# Altium footprint library Pcblib.PcbLib: 281 footprints (part 16 of 18)
Each footprint in its own frame and in the unit in brackets; x right, y up, seen from the top. Pads: shape width x height; smd on the part's side, far side on the other; paste and mask are expansions set on the pad; w line width, h text height; cw(c..) or ccw(c..) is an arc to the next point about the centre after c.
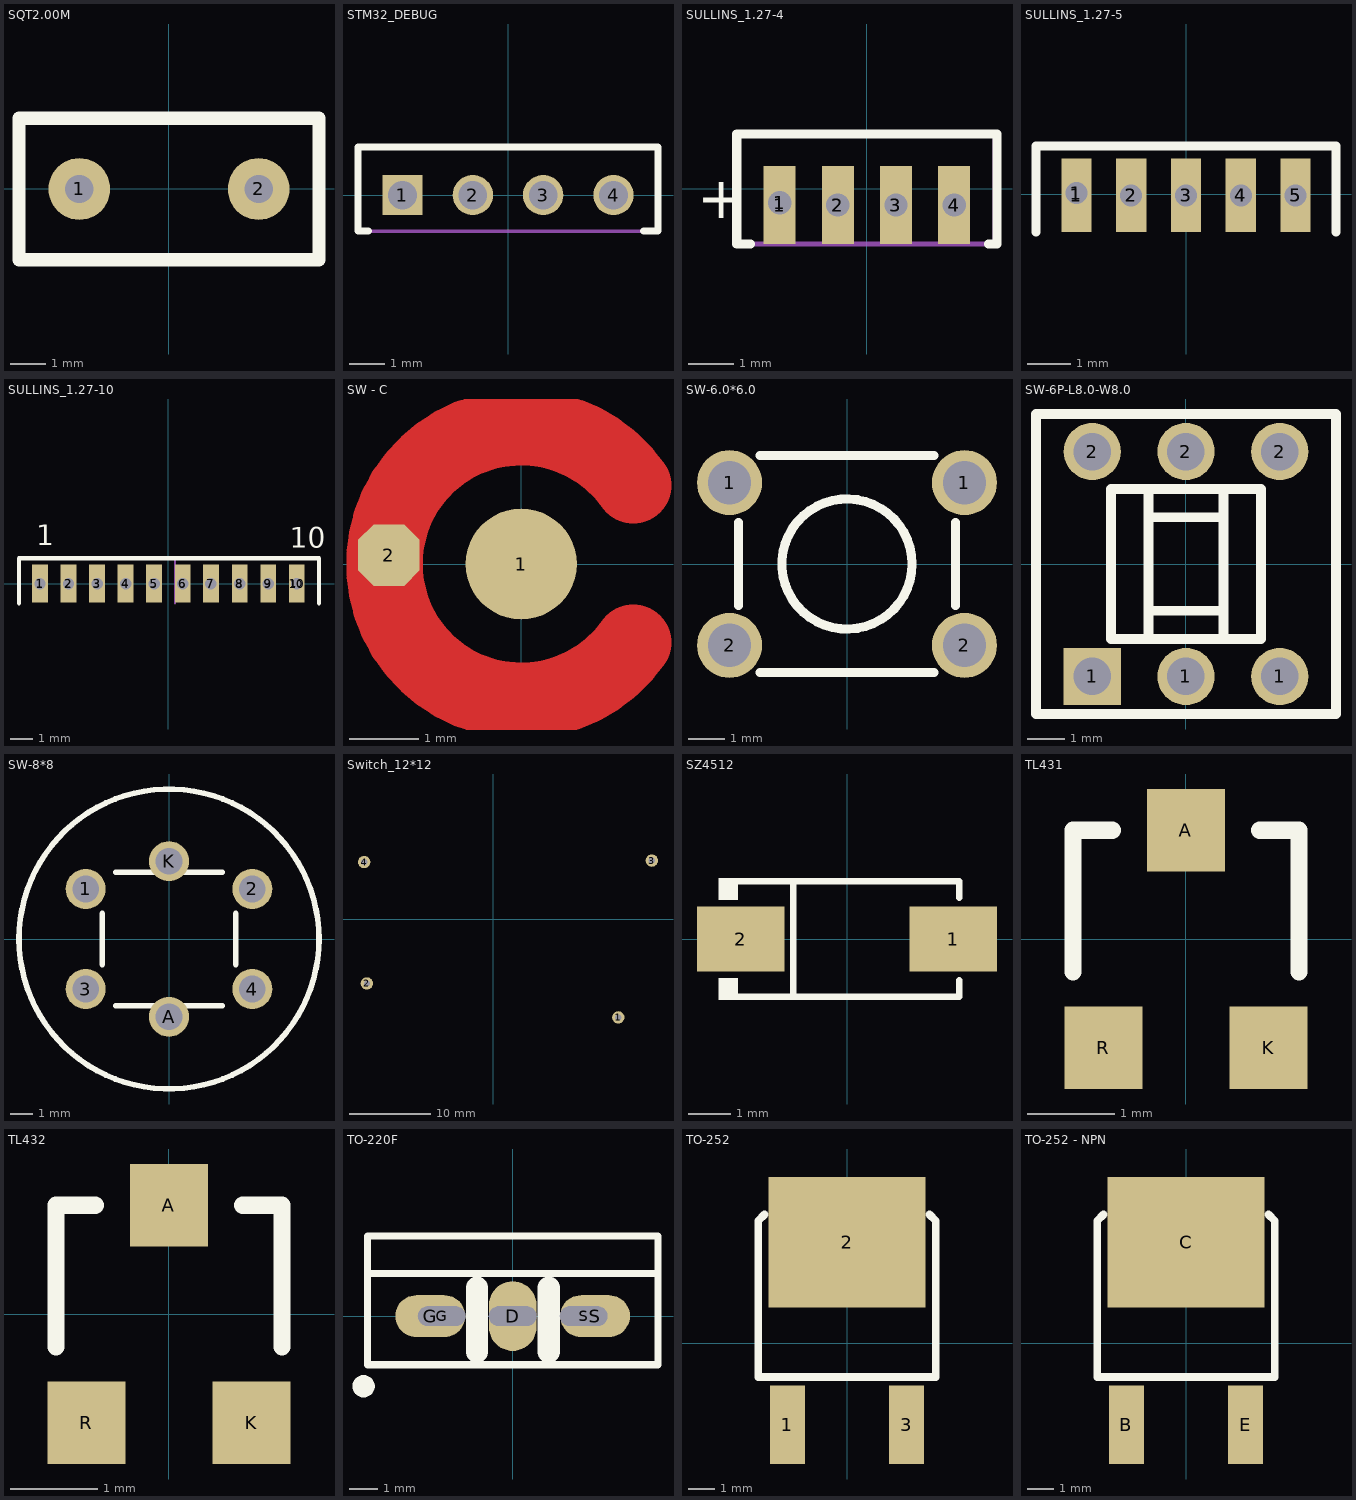
[diagram p15: the footprints below, top view; thin cyan lines are the x and y axes]

## SQT2.00M [mm]
height 17.5
pads (2):
  round 1.75 hole 0.8: 1(-2.54,0) 2(2.54,0)
Top Overlay:
  lines w0.381: -4.25,2 -4.25,-2 4.25,-2 4.25,2 -4.241,2

## STM32_DEBUG [mil]
pads (4):
  rect 45x45 hole 32: 1(-118.11,0)
  round 45 hole 32: 2(-39.37,0) 3(39.37,0) 4(118.11,0)
Top Overlay:
  lines w7.87: -156.11,-40.46 -167.92,-40.46 -167.92,54.02 -160.64,54.02 167.92,54.02 167.92,-40.46 151.89,-40.46
Mechanical 5:
  lines w3.94: -167.92,-40.46 166.89,-40.46 166.89,54.02 -167.92,54.02 -167.92,-40.46

## SULLINS_1.27-4 [mm] "Receptacle, 1.27mm, 6x1, SMT"
height 4.85
pads (8):
  rect 0.7x1.7 smd paste-1: 1(-1.905,-0.35) 2(-0.635,-0.35) 3(0.635,-0.35) 4(1.905,-0.35)
  round 0.686 hole 0.508: 1(-1.905,-0.3) 2(-0.635,-0.35) 3(0.635,-0.35) 4(1.905,-0.35)
Top Overlay:
  lines w0.2: -2.54,-1.2 -2.84,-1.2 -2.84,1.2 -2.655,1.2 2.794,1.2 ; 2.655,-1.2 2.84,-1.2 2.84,1.2
  text "+" at -3.708,-0.635 h0.91
Mechanical 5:
  lines w0.1: -2.84,-1.2 -2.84,1.2 2.794,1.2 2.794,-1.2 -2.84,-1.2
3D body: height 4.85, standoff 0.5, extent -2.84,-1.2 2.84,0
3D body: height 0.5, standoff 0.15, extent -2.84,-1.2 2.84,-0.635
3D body: height 4.85, standoff 4.65, extent -2.405,0.3 -1.405,0.5
3D body: height 4.85, standoff 4.65, extent -2.405,-0.5 -2.205,0.5
3D body: height 4.85, standoff 4.65, extent -2.405,-0.5 -1.405,-0.3
3D body: height 4.85, standoff 4.65, extent -1.605,-0.5 -1.405,0.5
3D body: height 4.85, standoff 4.65, extent -0.335,-0.5 -0.135,0.5
3D body: height 4.85, standoff 4.65, extent -1.135,-0.5 -0.135,-0.3
3D body: height 4.85, standoff 4.65, extent -1.135,-0.5 -0.935,0.5
3D body: height 4.85, standoff 4.65, extent -1.135,0.3 -0.135,0.5
3D body: height 4.85, standoff 4.65, extent 0.935,-0.5 1.135,0.5
3D body: height 4.85, standoff 4.65, extent 0.135,-0.5 1.135,-0.3
3D body: height 4.85, standoff 4.65, extent 0.135,-0.5 0.335,0.5
3D body: height 4.85, standoff 4.65, extent 0.135,0.3 1.135,0.5
3D body: height 4.85, standoff 4.65, extent 2.205,-0.5 2.405,0.5
3D body: height 4.85, standoff 4.65, extent 1.405,-0.5 2.405,-0.3
3D body: height 4.85, standoff 4.65, extent 1.405,-0.5 1.605,0.5
3D body: height 4.85, standoff 4.65, extent 1.405,0.3 2.405,0.5
3D body: height 4.85, standoff 4.65, extent 2.675,-0.5 2.875,0.5
3D body: height 0.5, standoff 0, extent -2.105,0.485 -1.705,0.635
3D body: height 0.5, standoff 0, extent 0.435,0.485 0.835,0.635
3D body: height 0.5, standoff 0, extent -0.835,-0.635 -0.435,-0.485
3D body: height 0.5, standoff 0, extent 1.705,-0.635 2.105,-0.485
3D body: height 0.6, standoff 0.5, extent -2.84,-0.635 2.84,0.635

## SULLINS_1.27-5 [mil] "Receptacle, 1.27mm, 6x1, SMT"
height 190.94
pads (10):
  rect 27.56x66.93 smd paste-39.37: 1(-100,-0.98) 2(-50,-0.98) 3(0,-0.98) 4(50,-0.98) 5(100,-0.98)
  round 27 hole 20: 1(-100,0.98) 2(-50,-0.98) 3(0,-0.98) 4(50,-0.98) 5(100,-0.98)
Top Overlay:
  lines w7.87: -136.81,-34.45 -136.81,44 136.81,44 136.81,-34.45
Mechanical 5:
  lines w3.94: -136.81,-34.45 -136.81,44 136.81,44 136.81,-34.45

## SULLINS_1.27-10 [mil] "Receptacle, 1.27mm, 6x1, SMT"
height 190.94
pads (20):
  rect 27.56x66.93 smd paste-39.37: 1(-225,0) 2(-175,0) 3(-125,0) 4(-75,0) 5(-25,0) 6(25,0) 7(74.61,0) 8(125,0) 9(175,0) 10(225,0)
  round 27 hole 20: 1(-225,0) 2(-175,0) 3(-125,0) 4(-75,0) 5(-25,0) 6(25,0) 7(74.61,0) 8(125,0) 9(175,0) 10(225,0)
Top Overlay:
  lines w7.87: -261.81,-34.45 -261.81,44 264,44 264,-34.45
  text "10" at 213,63 h36
  text "1" at -232,67 h36
Mechanical 5:
  lines w3.94: -261.81,-34.45 -261.81,44 11.81,44 11.81,-34.45

## SW - C [mil]
pads (2):
  round 62.99 smd paste-39.37: 1(0,0)
  oct 35x35 smd paste-39.37: 2(-75,5)
Top Layer:
  lines w43.31: 63.52,-44.48 cw(c0,0) 63.52,44.48
Top Solder:
  lines w50.31: 63.52,-44.48 cw(c0,0) 63.52,44.48

## SW-6.0*6.0 [mm]
pads (4):
  round 1.8 hole 1.2: 1(-3.25,2.25) 1(3.25,2.25) 2(-3.25,-2.25) 2(3.25,-2.25)
Top Overlay:
  circle w0.254: c0,0 r1.8
  lines w0.254: -3,-1.147 -3,1.147 ; -2.404,-3 2.404,-3 ; -2.404,3 2.404,3 ; 3,-1.147 3,1.147

## SW-6P-L8.0-W8.0 [mm]
pads (6):
  rect 1.524x1.524 hole 1: 1(-2.5,-3)
  round 1.524 hole 1: 1(0,-3) 1(2.5,-3) 2(-2.5,3) 2(0,3) 2(2.5,3)
Top Overlay:
  lines w0.254: -1,-2 -1,2 ; -1,-1.25 1,-1.25 ; -1,1.25 1,1.25 ; 1,-2 1,2 ; -4,-4 -4,4 4,4 4,-4 -4,-4 ; -2,-2 -2,2 2,2 2,-2 -2,-2

## SW-8*8 [mm]
pads (6):
  round 1.8 hole 1.2: 1(-3.75,2.25) 2(3.75,2.25) 3(-3.75,-2.25) 4(3.75,-2.25) A(0,-3.5) K(0,3.5)
Top Overlay:
  circle w0.254: c0,0 r6.75
  lines w0.254: -3,-1.147 -3,1.147 ; -2.404,-3 2.404,-3 ; -2.404,3 2.404,3 ; 3,-1.147 3,1.147
Bottom Overlay:
  circle w0.254: c0,0 r6.75

## Switch_12*12 [mil]
pads (4):
  round 60 hole 30: 1(608,-478) 2(-614,-313) 3(771,284) 4(-627,277)

## SZ4512 [mm]
pads (2):
  rect 2.063x1.539 smd: 1(2.504,0) 2(-2.504,0)
Top Overlay:
  region: -2.57,1.432 -2.57,0.922 -3.027,0.922 -3.027,1.432
  region: -2.57,-1.432 -2.57,-0.922 -3.027,-0.922 -3.027,-1.432
  lines w0.152: -2.646,-1.356 2.646,-1.356 2.646,-0.973 ; -2.646,1.356 2.646,1.356 2.646,0.973 ; -1.269,-1.356 -1.269,1.356
Mechanical 15:
  region: -2.378,-0.096 -2.378,0.096 -1.61,0.096 -1.61,-0.096
  region: 2.378,-0.096 2.378,0.096 1.61,0.096 1.61,-0.096
  region: 2.09,-0.64 2.09,0.64 1.898,0.64 1.898,-0.64

## TL431 [mm]
pads (3):
  rect 0.9x0.95 smd: A(0,1.25) K(0.95,-1.25) R(-0.95,-1.25)
Top Overlay:
  lines w0.2: -1.3,-0.375 -1.3,1.25 -0.85,1.25 ; 0.85,1.25 1.3,1.25 1.3,-0.375

## TL432 [mm]
pads (3):
  rect 0.9x0.95 smd: A(0,1.25) K(0.95,-1.25) R(-0.95,-1.25)
Top Overlay:
  lines w0.2: -1.3,-0.375 -1.3,1.25 -0.85,1.25 ; 0.85,1.25 1.3,1.25 1.3,-0.375

## TO-220F [mm]
pads (5):
  oval 1.7x2.5 hole 0.7 slot 1.7 at 0 deg: D(0,0)
  oval 2.5x1.5 all layers, no hole: G(-2.946,0) S(2.946,0)
  oval 1.7x0.7 hole 0.7 slot 1.7 at 0 deg: G(-2.54,0) S(2.54,0)
Top Overlay:
  lines w0.254: -5.2,1.521 5.2,1.521 ; -5.2,-1.74 -3.768,-1.74 5.2,-1.74 5.2,2.86 -5.2,2.86 -5.2,-1.74
  lines w0.4: -5.34,-2.31 ccw(c-5.337,-2.51) -5.335,-2.31
  lines w0.8: -1.28,-1.27 -1.28,1.016 ; 1.285,-1.27 1.285,1.016

## TO-252 [mm] "output current 500mA /FPM"
height 2.3
pads (3):
  rect 1.35x3 smd: 1(-2.285,-3.125) 3(2.285,-3.125)
  rect 6x5 smd: 2(0,3.875)
Top Overlay:
  lines w0.3: -3.162,4.937 -3.4,4.699 -3.4,-1.296 3.4,-1.296 3.4,4.699 3.162,4.937
3D body: height 1.35, standoff 0, extent -3.443,-0.204 3.415,5.13

## TO-252 - NPN [mm] "output current 500mA /FPM"
height 2.3
pads (3):
  rect 1.35x3 smd: B(-2.285,-3.125) E(2.285,-3.125)
  rect 6x5 smd: C(0,3.875)
Top Overlay:
  lines w0.3: -3.162,4.937 -3.4,4.699 -3.4,-1.296 3.4,-1.296 3.4,4.699 3.162,4.937
3D body: height 1.35, standoff 0, extent -3.443,-0.204 3.415,5.13